# Altium footprint library Toi Library.PcbLib: 740 footprints (part 42 of 47)
Each footprint in its own frame and in the unit in brackets; x right, y up, seen from the top. Pads: shape width x height; smd on the part's side, far side on the other; paste and mask are expansions set on the pad; w line width, h text height; cw(c..) or ccw(c..) is an arc to the next point about the centre after c.
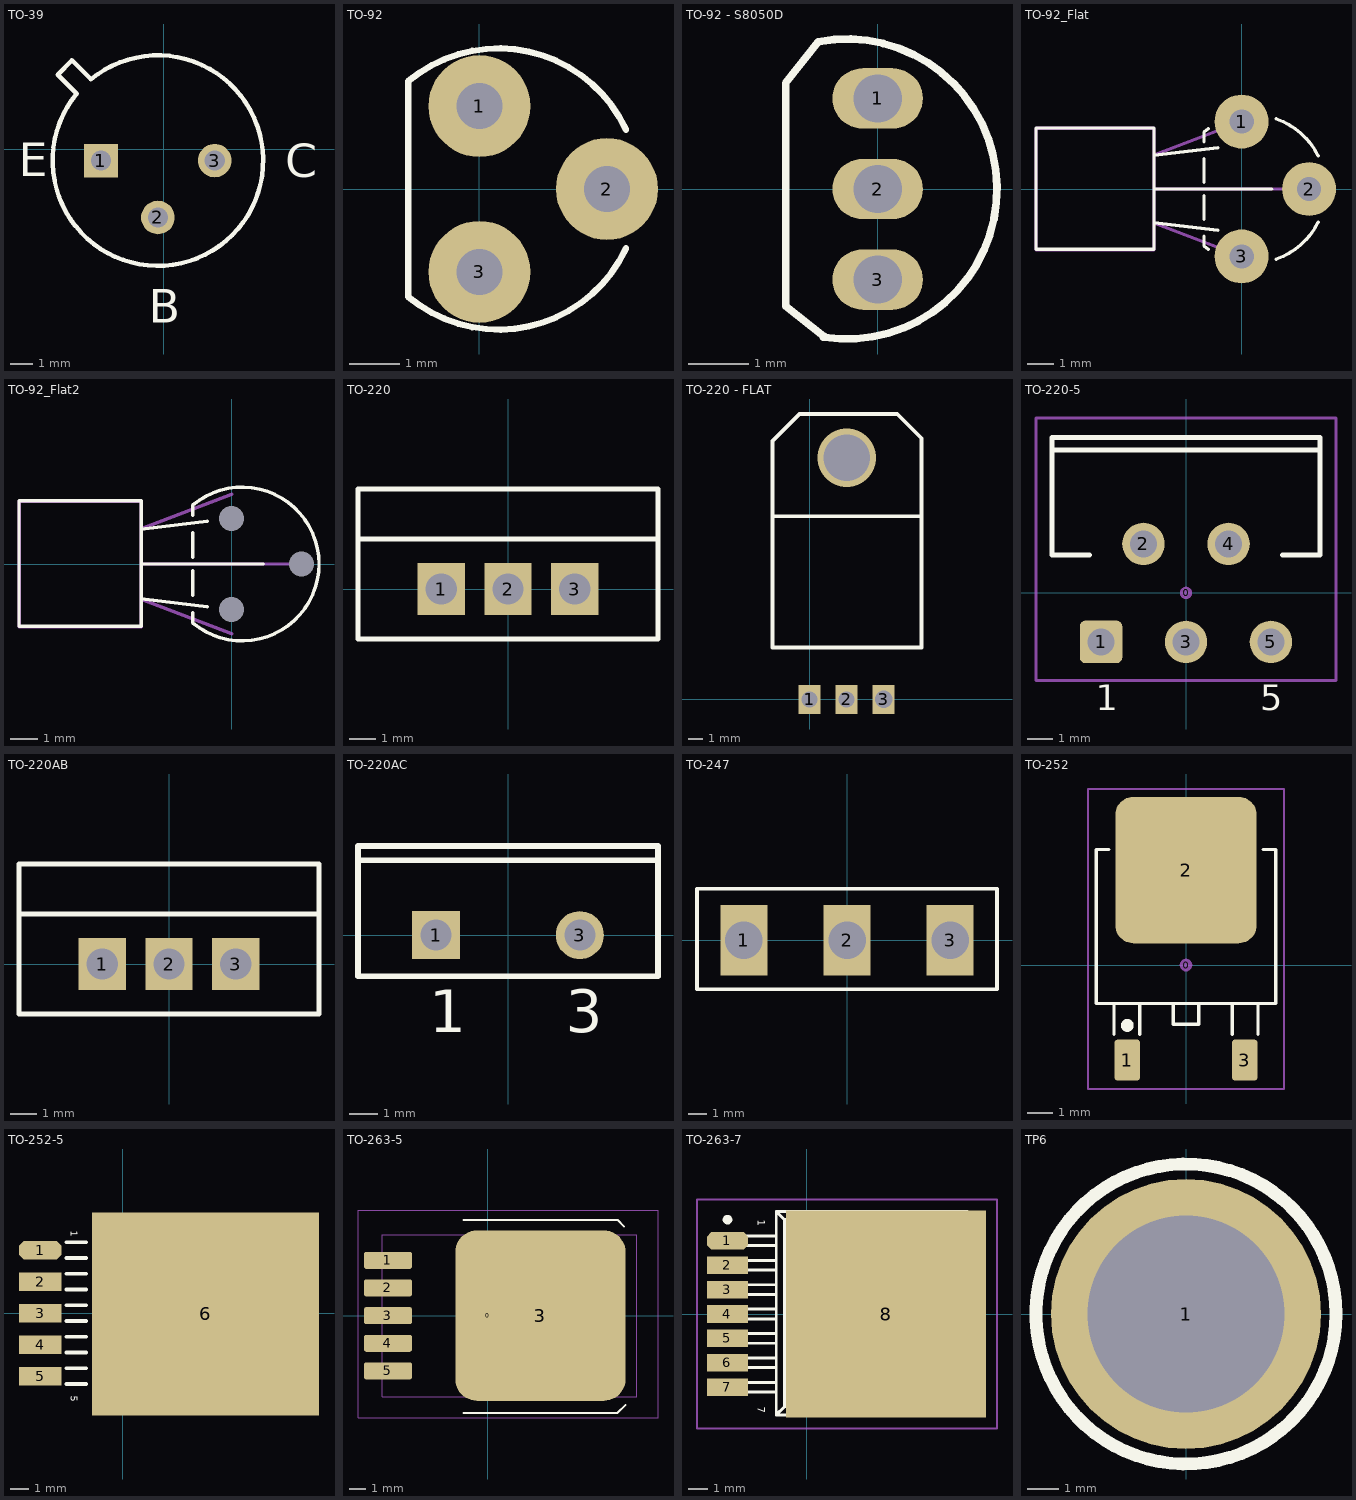
[diagram p41: the footprints below, top view; thin cyan lines are the x and y axes]

## TO-39 [mm]
pads (3):
  rect 1.5x1.5 hole 0.9: 1(-2.794,-0.508)
  round 1.5 hole 0.9: 2(-0.254,-3.048) 3(2.286,-0.508)
Top Overlay:
  lines w0.2: -4.729,3.33 -4.092,3.967 -3.244,3.118 cw(c-0.254,-0.508) -3.88,2.482 -4.729,3.33
  text "C" at 5.44,-1.259 h1.5
  text "B" at -0.669,-7.746 h1.5
  text "E" at -6.455,-1.205 h1.5
3D body "User Library-TO-39_TO-205AD.STEP": height 6.6, standoff -11.82, extent -4.947,-5.207 4.439,4.193

## TO-92 [mil]
height 397.64
pads (3):
  round 80 hole 36: 1(0,65) 2(100,0) 3(0,-65)
Top Overlay:
  lines w5: 114.91,-46.59 cw(c15,0) -55.86,-84.45 -55.86,84.45 cw(c15,0) 114.91,46.59
3D body "TO-92_A.stp": height 404.72, standoff -100, extent -54.52,-94.57 107.49,94.56

## TO-92 - S8050D [mm]
height 10.1
pads (3):
  oval 1.5x1 hole 0.8: 1(0,1.5) 2(0,0) 3(0,-1.5)
Top Overlay:
  lines w0.127: -0.899,-2.453 ccw(c-0.508,0) -0.984,2.438 -1.524,1.754 -1.524,-1.938 -0.888,-2.44
3D body "User Library-SS8050 Transistors NPN TO-92 3L (2,54mm).STEP": height 9.82, standoff -9.7, extent -1.524,-2.38 2.106,2.38

## TO-92_Flat [mil]
height 151.57
pads (3):
  round 80 hole 36: 1(0,100) 2(100,0) 3(0,-100)
Top Overlay:
  lines w5: -130.03,0 45,0 ; -130,-50 -35.14,-61.16 ; -130,50 -35.14,61.16 ; -55.86,-70 -55.86,-84.45 ccw(c15,0) -49.54,-89.37 ; -55.86,-45 -55.86,-10 ; -55.86,10 -55.86,45 ; -55.86,70 -55.86,84.45 cw(c15,0) -49.54,89.37 ; 51.42,-104.05 ccw(c15,0) 113.6,-49.3 ; 51.42,104.05 cw(c15,0) 113.6,49.3 ; -305.03,-89.45 -305.03,90.55 -130.03,90.55 -130.03,-89.45 -305.03,-89.45
Mechanical 13:
  lines w5: -130,-50.44 0,-100 ; -130,0.1 100,0 ; -130,50.44 0,100 ; -305,-90 -305,90 -130,90 -130,-90 -305,-90
3D body: height 141.73, standoff -100, extent -307.08,-109.84 109.85,109.85

## TO-92_Flat2 [mil]
height 151.57
pads (3):
  round 0 / inner round 0 / far side round 80 hole 36 unplated: 1(0,65) 2(100,0) 3(0,-65)
Top Overlay:
  lines w5: -130.03,0 45,0 ; -130,-50 -35.14,-61.16 ; -130,50 -35.14,61.16 ; -55.86,-70 -55.86,-84.45 ccw(c15,0) -55.86,84.45 -55.86,70 ; -55.86,-45 -55.86,-10 ; -55.86,10 -55.86,45 ; -305.03,-89.45 -305.03,90.55 -130.03,90.55 -130.03,-89.45 -305.03,-89.45
Mechanical 13:
  lines w5: -130,-50.44 0,-100 ; -130,0.1 100,0 ; -130,50.44 0,100 ; -305,-90 -305,90 -130,90 -130,-90 -305,-90
3D body: height 141.73, standoff -100, extent -307.08,-94.48 109.85,94.5

## TO-220 [mm]
pads (3):
  rect 1.8x2 hole 1.2: 1(-2.54,0) 2(0,0) 3(2.54,0)
Top Overlay:
  lines w0.2: -5.715,1.905 5.715,1.905 ; -5.715,-1.905 5.715,-1.905 5.715,3.81 -5.715,3.81 -5.715,2.54 -5.715,-1.905
3D body "User Library-TO-220-3.step": height 8.08, standoff -20.7, extent -4.925,-2.134 4.975,2.366

## TO-220 - FLAT [mm]
pads (3):
  rect 1.5x2 hole 1.1: 1(0,0) 2(2.54,0)
  rect 1.5x2 hole 1.2: 3(5.08,0)
via 2.54,16.562 diameter 4 hole 3.2
Top Overlay:
  lines w0.254: -2.54,5.861 -2.54,17.71 -0.686,19.564 6.007,19.564 7.671,17.901 7.671,3.562 -2.54,3.562 -2.54,12.554 7.671,12.554
3D body "TO220_NAM.step": height 4.45, standoff -1.79, extent -2.54,-0.19 7.62,19.09

## TO-220-5 [mm] "TO, Thru-Hole, Vertical, Heatsink Mounted; 5 Bent Staggered Leads; Pitch 1.7mm"
height 21.1
pads (6):
  round 0.5 on Mech15: 0(0,0)
  rrect25% 1.7x1.7 hole 1.092: 1(-3.4,-1.96)
  round 1.7 hole 1.092: 2(-1.7,1.96) 3(0,-1.96) 4(1.7,1.96) 5(3.4,-1.96)
Top Overlay:
  lines w0.2: -5.35,5.71 5.35,5.71 ; -3.854,1.51 -5.35,1.51 -5.35,6.21 5.35,6.21 5.35,1.51 3.854,1.51
  text "1" at -3.62,-4.685 h1.02
  text "5" at 2.98,-4.685 h1.02
Mechanical 15:
  lines w0.127: -6,-3.5 -6,7 6,7 6,-3.5 -6,-3.5
3D body "SW3dPS-TO220-5.STEP": height 20.99, standoff -3, extent -5.08,-2.16 5.08,6.08

## TO-220AB [mm]
pads (3):
  rect 1.8x2 hole 1.2: 1(-2.54,0) 2(0,0) 3(2.54,0)
Top Overlay:
  lines w0.2: -5.715,1.905 5.715,1.905 ; -5.715,-1.905 -5.715,2.54 -5.715,3.81 5.715,3.81 5.715,-1.905 -5.715,-1.905
3D body "SW3dPS-TO220AB.STEP": height 21.71, standoff -7.62, extent -5.606,-1.749 5.607,2.941

## TO-220AC [mm] "TO, Thru-Hole, Vertical, Heatsink Mounted; 3 In-Line Leads (1 Absent); Pitch 2.54 mm"
height 19.2
pads (2):
  rect 1.7x1.7 hole 1.1: 1(-2.54,0)
  round 1.7 hole 1.1: 3(2.54,0)
Top Overlay:
  lines w0.2: -5.3,2.65 5.3,2.65 ; -5.3,-1.45 5.3,-1.45 5.3,3.15 -5.3,3.15 -5.3,-1.45
  text "1" at -2.79,-3.425 h1.5
  text "3" at 2.04,-3.425 h1.5

## TO-247 [mil]
pads (3):
  rect 100x150 hole 80: 1(-220,0) 2(0,0) 3(220,0)
Top Overlay:
  lines w7.87: -320,-105 -320,-25 -320,110 320,110 320,-105 -320,-105
3D body "User Library-TO247.STEP": height 951.13, standoff -698.87, extent -320.08,-100 320.08,108.66

## TO-252 [mm] "D-PAK/TO-252-AA; 3 Leads (1 Cropped); Body 10.3 (inc. leads) x 6.7 mm (LxW max)"
height 2.38
pads (4):
  round 0.5 on Mech15: 0(0,0)
  rrect25% 1x1.6 smd: 1(-2.285,-3.7) 3(2.285,-3.7)
  rrect25% 5.5x5.7 smd: 2(0,3.7)
Top Overlay:
  circle w0.25: c-2.285,-2.35 r0.125
  lines w0.127: -3,4.5 -3.5,4.5 -3.5,-1.5 3.5,-1.5 3.5,4.5 3,4.5 ; -2.8,-2.7 -2.8,-1.5 -1.8,-1.5 -1.8,-2.7 ; 1.8,-2.7 1.8,-1.5 2.8,-1.5 2.8,-2.7 ; -0.5,-2.3 -0.5,-1.5 0.5,-1.5 0.5,-2.3 -0.5,-2.3
Mechanical 15:
  lines w0.076: -3.81,-4.826 -3.81,6.858 3.81,6.858 3.81,-4.826 -3.81,-4.826
3D body "DPAK.stp": height 2.31, standoff 0, extent -3.3,-3.951 3.3,5.762

## TO-252-5 [mil]
pads (6):
  oct 90x40 smd: 1(-175,133.33)
  rect 90x40 smd: 2(-175,66.67) 3(-175,0) 4(-175,-66.67) 5(-175,-133.33)
  rect 480x430 smd: 6(175,-1.67)
Top Overlay:
  lines w7.87: -120,-150 -78,-150 ; -120,-116.67 -78,-116.67 ; -120,-83.33 -78,-83.33 ; -120,-50 -78,-50 ; -120,-16.67 -78,-16.67 ; -120,16.67 -78,16.67 ; -120,50 -78,50 ; -120,83.33 -78,83.33 ; -120,116.67 -78,116.67 ; -120,150 -78,150
  text "5" at -110,-175 h15
  text "1" at -110,175 h15
Mechanical 13:
  lines w3.94: 290,-210 290,210 ; 290,-210 -50,-210 -50,210 290,210 ; 290,-210 360,-210 360,210 290,210
  lines w7.87: -50,-208.33 -33.33,-191.67 ; -50,-208.33 -50,208.33 ; -50,-208.33 291.67,-208.33 ; -50,208.33 -33.33,191.67 ; -50,208.33 291.67,208.33 ; -33.33,-191.67 -33.33,191.67 ; -33.33,-191.67 275,-191.67 ; -33.33,191.67 275,191.67 ; 275,-191.67 291.67,-208.33 ; 275,-191.67 275,191.67 ; 275,191.67 291.67,208.33 ; 291.67,-208.33 291.67,208.33 ; 291.67,-208.33 341.67,-208.33 358.33,-150 358.33,150 341.67,208.33 291.67,208.33
3D body: height 173.23, standoff 0, extent -49.98,-209.98 289.98,209.98
3D body: height 51.18, standoff 0, extent 290.02,-209.98 359.98,209.98

## TO-263-5 [mm] "D-PAK/TO-263-5; 5 Leads; Body 14.4 (inc. leads) x 10.4 mm (LxW max)"
height 4.65
pads (7):
  round 0.5 on Mech15: 0(0,0)
  rrect25% 2.95x1.05 smd: 1(-6.15,3.41) 2(-6.15,1.705) 3(-6.15,0) 4(-6.15,-1.705) 5(-6.15,-3.41)
  rrect25% 10.5x10.5 smd: 3(3.25,0)
Top Overlay:
  lines w0.127: -1.5,-6 8,-6 8.5,-5.5 ; -1.5,5.9 8,5.9 8.4,5.5
Mechanical 13:
  lines w0.076: -6.49,-5 -6.49,5 9.18,5 9.18,-5 -6.49,-5
Mechanical 15:
  lines w0.076: -8,-6.3 -8,6.5 10.5,6.5 10.5,-6.3 -8,-6.3
3D body "TO-263-5.stp": height 4.56, standoff 0, extent -6.727,-5.08 7.288,5.08

## TO-263-7 [mil] "LM2588 SIMPLE SWITCHER 5A Flyback Regulator with Shutdown"
height 179.92
pads (8):
  oct 85x36 smd: 1(-162.5,150)
  rect 85x36 smd: 2(-162.5,100) 3(-162.5,50) 4(-162.5,0) 5(-162.5,-50) 6(-162.5,-100) 7(-162.5,-150)
  rect 410x425 smd: 8(162.5,0)
Top Overlay:
  circle w9.84: c-162.5,193.33 r4.92
  lines w6: -62.5,-160 -162.5,-160 -162.5,-140 -62.5,-140 ; -62.5,-110 -162.5,-110 -162.5,-90 -62.5,-90 ; -62.5,-60 -162.5,-60 -162.5,-40 -62.5,-40 ; -62.5,-10 -162.5,-10 -162.5,10 -62.5,10 ; -62.5,40 -162.5,40 -162.5,60 -62.5,60 ; -62.5,90 -162.5,90 -162.5,110 -62.5,110 ; -62.5,140 -162.5,140 -162.5,160 -62.5,160 ; -62.5,-206.67 -45.83,-190 ; -62.5,-206.67 -62.5,210 ; -62.5,-206.67 279.17,-206.67 ; -62.5,210 -45.83,193.33 ; -62.5,210 279.17,210 ; -45.83,-190 -45.83,193.33 ; -45.83,-190 262.5,-190 ; -45.83,193.33 262.5,193.33 ; 262.5,-190 279.17,-206.67 ; 262.5,-190 262.5,193.33 ; 262.5,193.33 279.17,210 ; 279.17,-206.67 279.17,210 ; 279.17,-206.67 329.17,-206.67 345.83,-148.33 345.83,151.67 329.17,210 279.17,210
  text "7" at -100,-190 h15
  text "1" at -100,193.33 h15
Mechanical 15:
  lines w3.94: -19.69,0 19.68,0 ; 0,-19.68 0,19.68 ; -225,-235 -225,235 390,235 390,-235 -225,-235
3D body: height 183.07, standoff 0, extent -62.5,-206.67 279.17,210

## TP6 [mm] "Jac cap 6ly"
height 3.81
pads (1):
  round 8.5 hole 6.2: 1(0,0)
Top Overlay:
  circle w0.406: c0,0 r4.724